# Altium footprint library ref-packages-longpad.PCBLIB: 1527 footprints (part 101 of 103)
Each footprint in its own frame and in the unit in brackets; x right, y up, seen from the top. Pads: shape width x height; smd on the part's side, far side on the other; paste and mask are expansions set on the pad; w line width, h text height; cw(c..) or ccw(c..) is an arc to the next point about the centre after c.
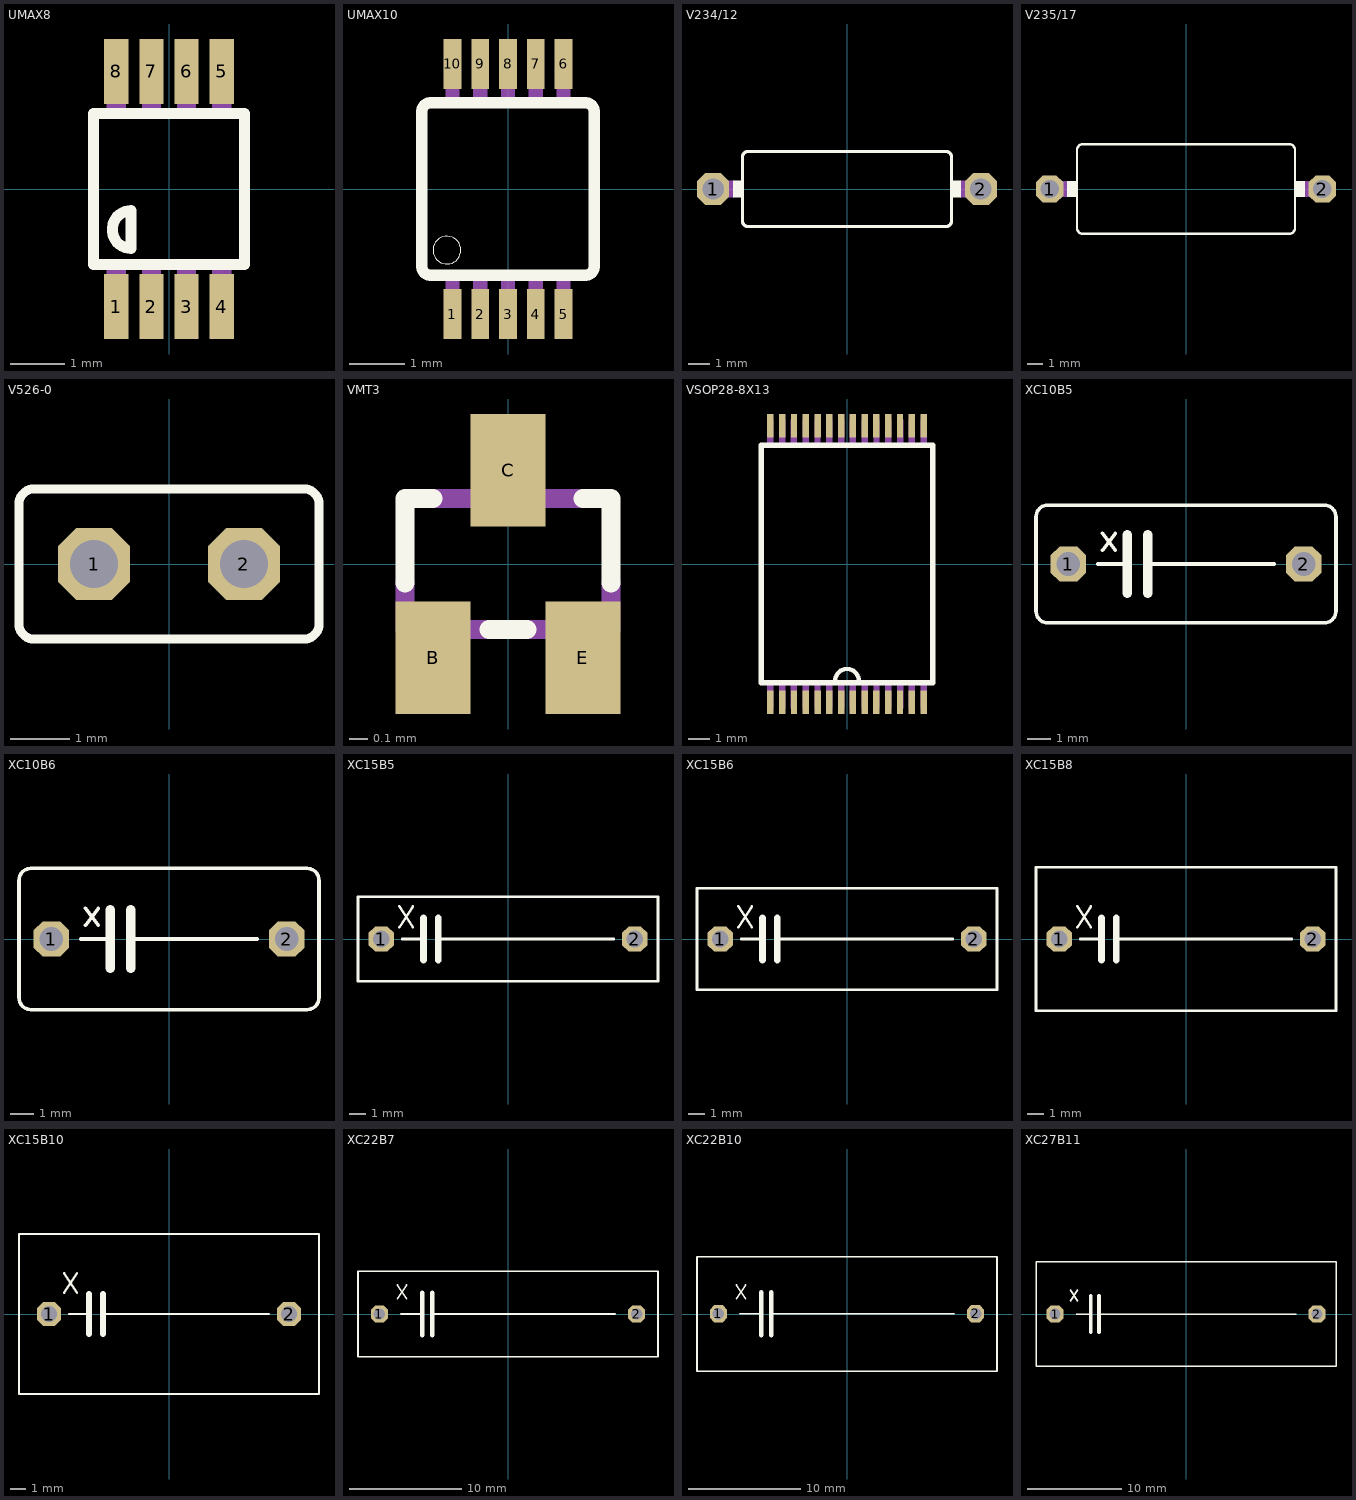
[diagram p100: the footprints below, top view; thin cyan lines are the x and y axes]

## UMAX8 [mm]
pads (8):
  rect 0.45x1.2 smd: 1(-0.975,-2.175) 2(-0.325,-2.175) 3(0.325,-2.175) 4(0.975,-2.175) 5(0.975,2.175) 6(0.325,2.175) 7(-0.325,2.175) 8(-0.975,2.175)
Top Overlay:
  lines w0.203: -1.4,-1.4 1.4,-1.4 1.4,1.4 -1.4,1.4 -1.4,-1.4 ; -0.7,-1.1 cw(c-0.7,-0.75) -0.7,-0.4 -0.7,-1.1
Mechanical 16:
  rectangle: -1.153,-2.404 -0.797,-1.438
  rectangle: -0.503,-2.404 -0.147,-1.438
  rectangle: 0.147,-2.404 0.503,-1.438
  rectangle: 0.797,-2.404 1.153,-1.438
  rectangle: 0.797,1.438 1.153,2.404
  rectangle: 0.147,1.438 0.503,2.404
  rectangle: -0.503,1.438 -0.147,2.404
  rectangle: -1.153,1.438 -0.797,2.404

## UMAX10 [mm]
pads (10):
  rect 0.32x0.9 smd: 1(-1,-2.25) 2(-0.5,-2.25) 3(0,-2.25) 4(0.5,-2.25) 5(1,-2.25) 6(1,2.25) 7(0.5,2.25) 8(0,2.25) 9(-0.5,2.25) 10(-1,2.25)
Top Overlay:
  circle w0: c-1.1,-1.1 r0.25
  lines w0.203: -1.55,-1.4 ccw(c-1.4,-1.4) -1.4,-1.55 1.4,-1.55 ccw(c1.4,-1.4) 1.55,-1.4 1.55,1.4 ccw(c1.4,1.4) 1.4,1.55 -1.4,1.55 ccw(c-1.4,1.4) -1.55,1.4 -1.55,-1.4
Mechanical 16:
  rectangle: -1.127,-2.565 -0.873,-1.626
  rectangle: -0.627,-2.565 -0.373,-1.626
  rectangle: -0.127,-2.565 0.127,-1.626
  rectangle: 0.373,-2.565 0.627,-1.626
  rectangle: 0.873,-2.565 1.127,-1.626
  rectangle: 0.873,1.626 1.127,2.565
  rectangle: 0.373,1.626 0.627,2.565
  rectangle: -0.127,1.626 0.127,2.565
  rectangle: -0.627,1.626 -0.373,2.565
  rectangle: -1.127,1.626 -0.873,2.565

## V234/12 [mil]
pads (2):
  oct 60x60 hole 40: 1(-250,0) 2(250,0)
Top Overlay:
  rectangle: 195,-16 213,16
  rectangle: -213,-16 -195,16
  lines w6: -195,-60 ccw(c-185,-60) -185,-70 185,-70 ccw(c185,-60) 195,-60 195,60 ccw(c185,60) 185,70 -185,70 ccw(c-185,60) -195,60 -195,-60
Mechanical 16:
  lines w32: -250,0 -215,0 ; 215,0 250,0

## V235/17 [mil]
pads (2):
  oct 70.5x70.5 hole 47: 1(-350,0) 2(350,0)
Top Overlay:
  rectangle: 280,-20 305,20
  rectangle: -305,-20 -280,20
  lines w6: -280,-100 -280,100 cw(c-265,100) -265,115 265,115 cw(c265,100) 280,100 280,-100 cw(c265,-100) 265,-115 -265,-115 cw(c-265,-100) -280,-100
Mechanical 16:
  lines w40: -350,0 -310,0 ; 310,0 350,0

## V526-0 [mil]
pads (2):
  oct 48x48 hole 32: 1(-50,0) 2(50,0)
Top Overlay:
  lines w6: -100,-40 ccw(c-90,-40) -90,-50 90,-50 ccw(c90,-40) 100,-40 100,40 ccw(c90,40) 90,50 -90,50 ccw(c-90,40) -100,40 -100,-40

## VMT3 [mil]
pads (3):
  rect 15.75x23.62 smd: B(-15.75,-19.69) C(0,19.69) E(15.75,-19.69)
Top Overlay:
  lines w4: -21.65,-3.94 -21.65,13.78 -15.75,13.78 ; -3.94,-13.78 3.94,-13.78 ; 15.75,13.78 21.65,13.78 21.65,-3.94
Mechanical 16:
  rectangle: 11.42,-23.62 20.08,-15.35
  rectangle: -20.08,-23.62 -11.42,-15.35
  rectangle: -6.3,15.35 6.3,23.62
  lines w4: -21.65,-3.94 -21.65,-13.78 -3.94,-13.78 ; -15.75,13.78 15.75,13.78 ; 3.94,-13.78 21.65,-13.78 21.65,-3.94

## VSOP28-8X13 [mm]
pads (28):
  rect 0.3x1.1 smd: 1(0.275,-6.45) 2(0.825,-6.45) 3(1.375,-6.45) 4(1.925,-6.45) 5(2.475,-6.45) 6(3.025,-6.45) 7(3.575,-6.45) 8(3.575,6.45) 9(3.025,6.45) 10(2.475,6.45) 11(1.925,6.45) 12(1.375,6.45) 13(0.825,6.45) 14(0.275,6.45) 15(-0.275,6.45) 16(-0.825,6.45) 17(-1.375,6.45) 18(-1.925,6.45) 19(-2.475,6.45) 20(-3.025,6.45) 21(-3.575,6.45) 22(-3.575,-6.45) 23(-3.025,-6.45) 24(-2.475,-6.45) 25(-1.925,-6.45) 26(-1.375,-6.45) 27(-0.825,-6.45) 28(-0.275,-6.45)
Top Overlay:
  lines w0.203: -0.55,-5.45 cw(c0,-5.45) 0.55,-5.45
  lines w0.254: -4,-5.55 -4,5.55 4,5.55 4,-5.55 -4,-5.55
Mechanical 16:
  rectangle: 0.125,-6.75 0.425,-5.55
  rectangle: 0.675,-6.75 0.975,-5.55
  rectangle: 1.225,-6.75 1.525,-5.55
  rectangle: 1.775,-6.75 2.075,-5.55
  rectangle: 2.325,-6.75 2.625,-5.55
  rectangle: 2.875,-6.75 3.175,-5.55
  rectangle: 3.425,-6.75 3.725,-5.55
  rectangle: 3.425,5.55 3.725,6.75
  rectangle: 2.875,5.55 3.175,6.75
  rectangle: 2.325,5.55 2.625,6.75
  rectangle: 1.775,5.55 2.075,6.75
  rectangle: 1.225,5.55 1.525,6.75
  rectangle: 0.675,5.55 0.975,6.75
  rectangle: 0.125,5.55 0.425,6.75
  rectangle: -0.425,5.55 -0.125,6.75
  rectangle: -0.975,5.55 -0.675,6.75
  rectangle: -1.525,5.55 -1.225,6.75
  rectangle: -2.075,5.55 -1.775,6.75
  rectangle: -2.625,5.55 -2.325,6.75
  rectangle: -3.175,5.55 -2.875,6.75
  rectangle: -3.725,5.55 -3.425,6.75
  rectangle: -3.725,-6.75 -3.425,-5.55
  rectangle: -3.175,-6.75 -2.875,-5.55
  rectangle: -2.625,-6.75 -2.325,-5.55
  rectangle: -2.075,-6.75 -1.775,-5.55
  rectangle: -1.525,-6.75 -1.225,-5.55
  rectangle: -0.975,-6.75 -0.675,-5.55
  rectangle: -0.425,-6.75 -0.125,-5.55

## XC10B5 [mil]
pads (2):
  oct 60x60 hole 40: 1(-200,0) 2(200,0)
Top Overlay:
  lines w6: -150,0 -100,0 ; -142,23 -120,52 ; -142,52 -120,23 ; -65,0 150,0 ; -255,-80 -255,80 cw(c-235,80) -235,100 235,100 cw(c235,80) 255,80 255,-80 cw(c235,-80) 235,-100 -235,-100 cw(c-235,-80) -255,-80
  lines w16: -100,-50 -100,0 -100,50 ; -65,-50 -65,0 -65,50

## XC10B6 [mil]
pads (2):
  oct 60x60 hole 40: 1(-200,0) 2(200,0)
Top Overlay:
  lines w6: -150,0 -100,0 ; -142,23 -120,52 ; -142,52 -120,23 ; -65,0 150,0 ; -255,-100 -255,100 cw(c-235,100) -235,120 235,120 cw(c235,100) 255,100 255,-100 cw(c235,-100) 235,-120 -235,-120 cw(c-235,-100) -255,-100
  lines w16: -100,-50 -100,0 -100,50 ; -65,-50 -65,0 -65,50

## XC15B5 [mil]
pads (2):
  oct 60x60 hole 40: 1(-300,0) 2(300,0)
Top Overlay:
  lines w6: -257,28 -225,77 ; -257,77 -225,28 ; -250,0 -200,0 ; -165,0 250,0 ; -355,-100 355,-100 355,100 -355,100 -355,-100
  lines w16: -200,-50 -200,0 -200,50 ; -165,-50 -165,0 -165,50

## XC15B6 [mil]
pads (2):
  oct 60x60 hole 40: 1(-300,0) 2(300,0)
Top Overlay:
  lines w6: -257,28 -225,77 ; -257,77 -225,28 ; -250,0 -200,0 ; -165,0 250,0 ; -355,-120 355,-120 355,120 -355,120 -355,-120
  lines w16: -200,-50 -200,0 -200,50 ; -165,-50 -165,0 -165,50

## XC15B8 [mil]
pads (2):
  oct 60x60 hole 40: 1(-300,0) 2(300,0)
Top Overlay:
  lines w6: -257,28 -225,77 ; -257,77 -225,28 ; -250,0 -200,0 ; -165,0 250,0 ; -355,-170 355,-170 355,170 -355,170 -355,-170
  lines w16: -200,-50 -200,0 -200,50 ; -165,-50 -165,0 -165,50

## XC15B10 [mil]
pads (2):
  oct 60x60 hole 40: 1(-300,0) 2(300,0)
Top Overlay:
  lines w6: -262,53 -230,102 ; -262,102 -230,53 ; -250,0 -200,0 ; -165,0 250,0 ; -375,-200 375,-200 375,200 -375,200 -375,-200
  lines w16: -200,-50 -200,0 -200,50 ; -165,-50 -165,0 -165,50

## XC22B7 [mil]
pads (2):
  oct 60x60 hole 40: 1(-450,0) 2(450,0)
Top Overlay:
  lines w6: -387,53 -355,102 ; -387,102 -355,53 ; -375,0 -300,0 ; -265,0 375,0 ; -525,-150 525,-150 525,150 -525,150 -525,-150
  lines w16: -300,-75 -300,0 -300,75 ; -265,-75 -265,0 -265,75

## XC22B10 [mil]
pads (2):
  oct 60x60 hole 40: 1(-450,1) 2(450,1)
Top Overlay:
  lines w6: -387,53 -355,102 ; -387,102 -355,53 ; -375,1 -300,1 ; -265,1 375,1 ; -525,-200 525,-200 525,200 -525,200 -525,-200
  lines w16: -300,-74 -300,1 -300,76 ; -265,-74 -265,1 -265,76

## XC27B11 [mil]
pads (2):
  oct 70.5x70.5 hole 47: 1(-550,0) 2(550,0)
Top Overlay:
  lines w6: -487,53 -455,102 ; -487,102 -455,53 ; -462,0 -400,0 ; -365,0 462,0 ; -630,-220 630,-220 630,220 -630,220 -630,-220
  lines w16: -400,-75 -400,0 -400,75 ; -365,-75 -365,0 -365,75